# Altium footprint library Connectors.PcbLib: 79 footprints (part 1 of 5)
Each footprint in its own frame and in the unit in brackets; x right, y up, seen from the top. Pads: shape width x height; smd on the part's side, far side on the other; paste and mask are expansions set on the pad; w line width, h text height; cw(c..) or ccw(c..) is an arc to the next point about the centre after c.
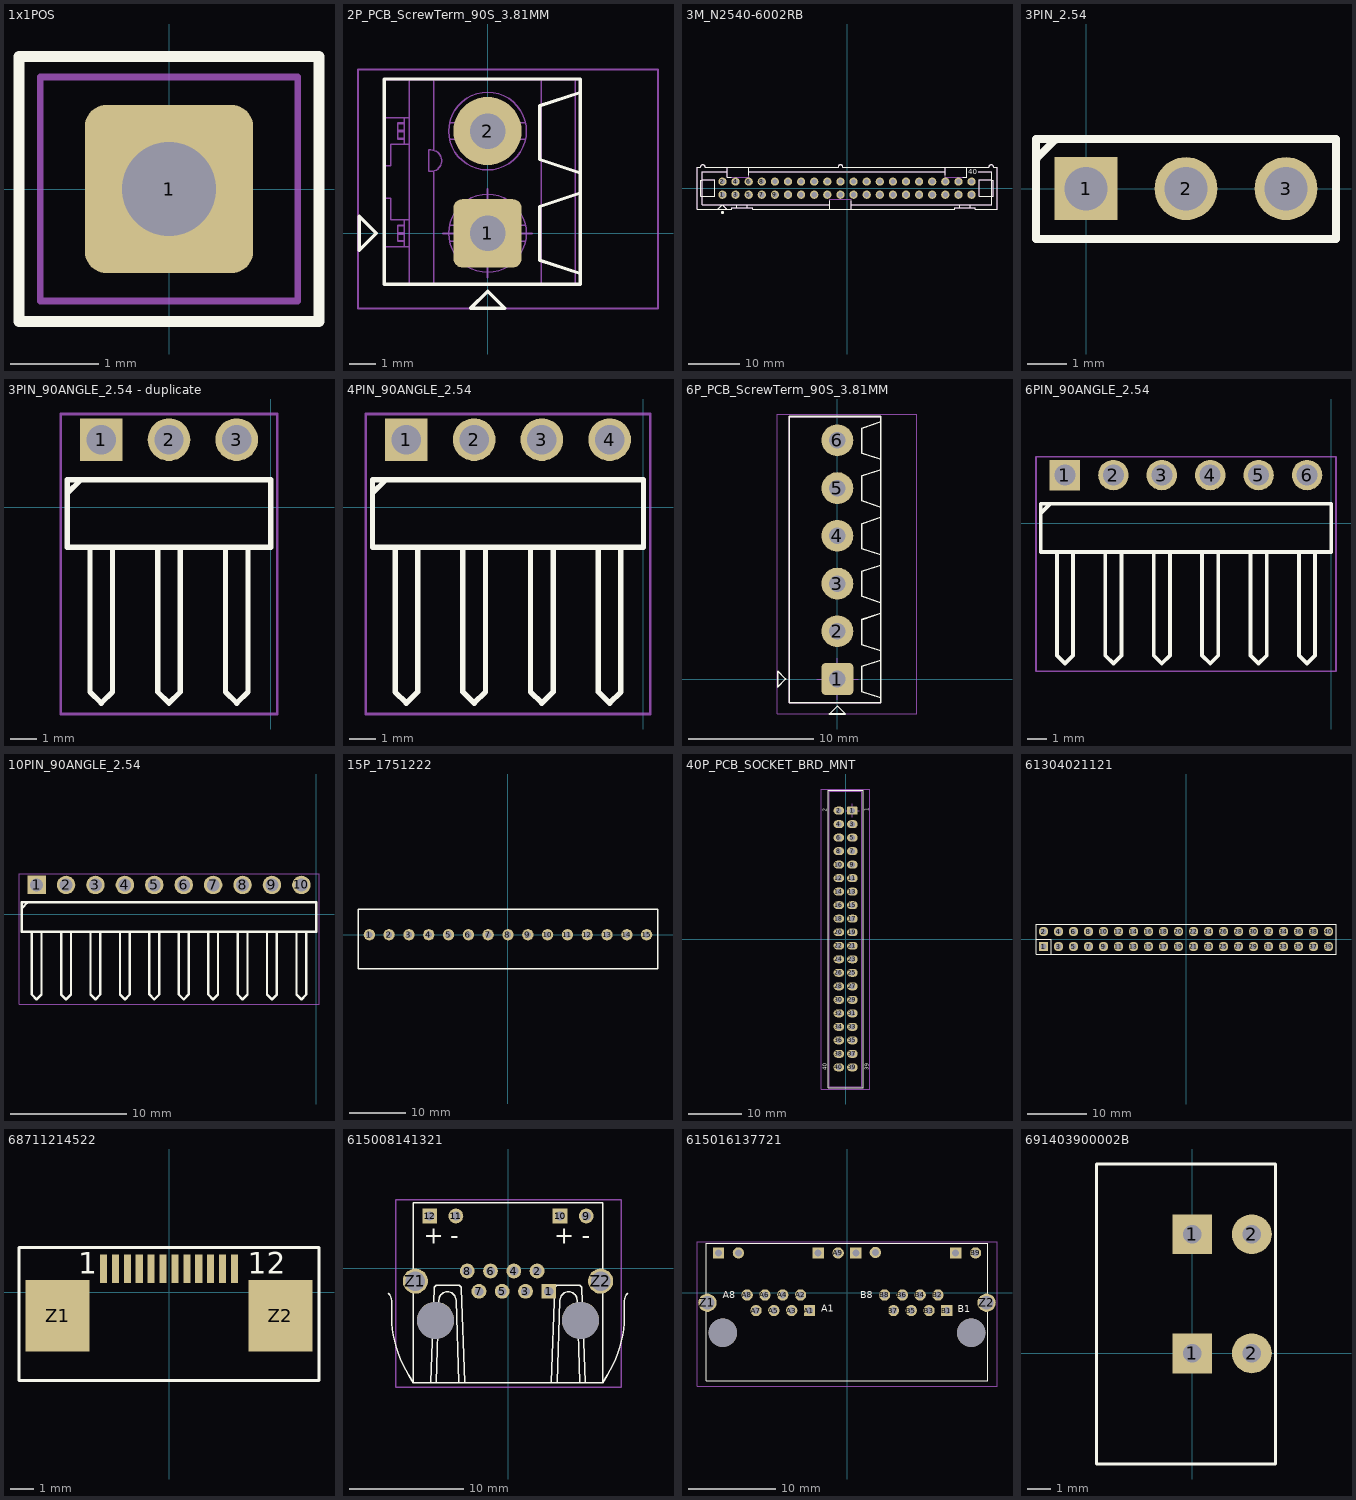
[diagram p0: the footprints below, top view; thin cyan lines are the x and y axes]

## 1x1POS [mil] "Connector Header, Single-row 1-position, 0.100\" pitch"
height 267
pads (1):
  rrect25% 75x75 hole 42: 1(0,0)
Top Overlay:
  lines w5: -66.93,-59.06 66.93,-59.06 66.93,59.06 -66.93,59.06 -66.93,-59.06
Mechanical 13:
  lines w3: -57.47,-50 57.49,-50 57.49,50 -57.47,50 -57.47,-50
3D body "PinHeaderMating 1P.stp": height 267, standoff -118, extent -57.47,-50 57.49,50

## 2P_PCB_ScrewTerm_90S_3.81MM [mil] "TERM BLOCK 2POS SIDE ENT STACKABLE 3.81MM"
height 334.65
pads (2):
  rrect25% 100x100 hole 52: 1(0,0)
  round 100 hole 52: 2(0,150)
Top Overlay:
  lines w5: 135.83,-59.06 76.78,-39.37 76.78,39.37 135.83,59.06 ; 135.83,88.58 76.78,108.27 76.78,187.01 135.83,206.69 ; -188,-25 -188,25 -163,0 -188,-25 ; -151.57,-75 135.83,-75 135.83,226.38 -151.57,226.38 -151.57,-75 ; -25,-110 0,-85 25,-110 -25,-110
Mechanical 13:
  circle w1.97: c0,150 r57.09
  circle w1.97: c0,0 r57.09
  lines w1.97: -151.57,-19.69 -114.76,-19.69 -114.76,19.68 -141.73,19.68 -141.73,51.18 -151.57,51.18 ; -151.57,98.82 -141.73,98.82 -141.73,130.31 -114.76,130.31 -114.76,169.69 -151.57,169.69 ; -131.89,-10.91 -122.05,-10.91 ; -131.89,-1.06 -122.05,-1.06 ; -131.89,1.06 -122.05,1.06 ; -131.89,10.91 -122.05,10.91 ; -131.89,139.09 -122.05,139.09 ; -131.89,148.94 -122.05,148.94 ; -131.89,151.06 -122.05,151.06 ; -131.89,160.91 -122.05,160.91 ; -122.05,-19.69 -122.05,19.68 ; -122.05,-11.81 -131.89,-11.81 -131.89,11.81 -122.05,11.81 ; -122.05,130.31 -122.05,169.69 ; -122.05,138.19 -131.89,138.19 -131.89,161.81 -122.05,161.81 ; -114.56,-75 -114.56,225 ; -78.74,-75 -78.74,91.34 ; -78.74,121.65 -78.74,225 ; -55.85,-11.81 55.85,-11.81 ; -55.85,11.81 55.85,11.81 ; -55.85,138.19 55.85,138.19 ; -55.85,161.81 55.85,161.81 ; 78.74,-75 78.74,225 ; 128.89,-75 128.89,225 ; -151.57,-75 135.83,-75 135.83,225 -151.57,225 -151.57,-75 ; -85.91,90.75 -85.91,122.24 -83.03,122.24 cw(c-83.03,106.5) -83.03,90.75 -85.91,90.75
Mechanical 15:
  lines w3: -65,0 65,0 ; 0,-65 0,65 ; -190,-110 250,-110 250,240 -190,240 -190,-110
3D body "c-1776113-2-o-3d.stp": height 334.65, standoff -137.8, extent -151.57,-75.19 135.83,224.81

## 3M_N2540-6002RB [mm] "40 Contacts - Straight .100\" x .100\" Low Profile Four-Wall Header"
height 10.03
pads (40):
  round 1.6 hole 1: 1(-24.13,-1.27) 2(-24.13,1.27) 3(-21.59,-1.27) 4(-21.59,1.27) 5(-19.05,-1.27) 6(-19.05,1.27) 7(-16.51,-1.27) 8(-16.51,1.27) 9(-13.97,-1.27) 10(-13.97,1.27) 11(-11.43,-1.27) 12(-11.43,1.27) 13(-8.89,-1.27) 14(-8.89,1.27) 15(-6.35,-1.27) 16(-6.35,1.27) 17(-3.81,-1.27) 18(-3.81,1.27) 19(-1.27,-1.27) 20(-1.27,1.27) 21(1.27,-1.27) 22(1.27,1.27) 23(3.81,-1.27) 24(3.81,1.27) 25(6.35,-1.27) 26(6.35,1.27) 27(8.89,-1.27) 28(8.89,1.27) 29(11.43,-1.27) 30(11.43,1.27) 31(13.97,-1.27) 32(13.97,1.27) 33(16.51,-1.27) 34(16.51,1.27) 35(19.05,-1.27) 36(19.05,1.27) 37(21.59,-1.27) 38(21.59,1.27) 39(24.13,-1.27) 40(24.13,1.27)
Top Overlay:
  circle w0.3: c-24.13,-4.699 r0.15
  lines w0.2: -28.042,-1.603 -25.629,-1.603 -25.629,1.603 -28.042,1.603 ; -28.042,-1.524 -28.346,-1.524 -28.346,1.524 -28.042,1.524 ; -24.994,-4.064 -24.13,-3.2 -23.266,-4.064 ; -23.178,3.15 -28.042,3.15 -28.042,-3.2 -3.366,-3.2 ; -23.178,4.064 -23.178,2.159 -22.469,2.159 ; -21.361,-3.835 -21.361,-3.2 ; -19.279,-3.835 -19.279,-3.2 ; -18.987,2.518 -18.987,4.064 ; -18.987,3.15 18.987,3.15 ; -3.366,-4.064 -3.366,-2.438 ; 0.826,-4.064 0.826,-2.438 ; 0.826,-3.2 28.042,-3.2 28.042,3.15 25.4,3.15 ; 18.987,2.518 18.987,4.064 ; 21.819,-3.835 21.819,-3.2 ; 22.469,2.159 23.178,2.159 23.178,4.064 ; 23.901,-3.835 23.901,-3.2 ; 28.042,-1.603 25.629,-1.603 25.629,1.603 28.042,1.603 ; 28.042,-1.524 28.346,-1.524 28.346,1.524 28.042,1.524 ; -29.058,-4.064 -29.058,4.064 -28.397,4.064 cw(c-27.94,4.064) -27.483,4.064 -1.727,4.064 cw(c-1.27,4.064) -0.813,4.064 27.483,4.064 cw(c27.94,4.064) 28.397,4.064 29.058,4.064 29.058,-4.064 24.892,-4.064 24.892,-3.835 20.828,-3.835 20.828,-4.064 -18.288,-4.064 -18.288,-3.835 -22.352,-3.835 -22.352,-4.064 -29.058,-4.064
  text "40" at 23.495,2.667 h1.02
Mechanical 14:
  lines w0.1: -28.042,-1.603 -25.629,-1.603 -25.629,1.603 -28.042,1.603 ; -28.042,-1.524 -28.346,-1.524 -28.346,1.524 -28.042,1.524 ; -24.994,-4.064 -24.13,-3.2 -23.266,-4.064 ; -23.178,3.15 -28.042,3.15 -28.042,-3.2 -3.366,-3.2 ; -23.178,4.064 -23.178,2.159 -18.987,2.159 -18.987,4.064 ; -21.361,-3.835 -21.361,-3.2 ; -19.279,-3.835 -19.279,-3.2 ; -18.987,3.15 18.987,3.15 ; -3.366,-4.064 -3.366,-2.159 0.826,-2.159 0.826,-4.064 ; 0.826,-3.2 28.042,-3.2 28.042,3.15 25.4,3.15 ; 18.987,4.064 18.987,2.159 23.178,2.159 23.178,4.064 ; 21.819,-3.835 21.819,-3.2 ; 23.901,-3.835 23.901,-3.2 ; 28.042,-1.603 25.629,-1.603 25.629,1.603 28.042,1.603 ; 28.042,-1.524 28.346,-1.524 28.346,1.524 28.042,1.524 ; -29.058,-4.064 -29.058,4.064 -28.397,4.064 cw(c-27.94,4.064) -27.483,4.064 -1.727,4.064 cw(c-1.27,4.064) -0.813,4.064 27.483,4.064 cw(c27.94,4.064) 28.397,4.064 29.058,4.064 29.058,-4.064 24.892,-4.064 24.892,-3.835 20.828,-3.835 20.828,-4.064 -18.288,-4.064 -18.288,-3.835 -22.352,-3.835 -22.352,-4.064 -29.058,-4.064
  text "40" at 23.495,2.667 h1.02
3D body "3M_N2540-6002RB.stp": height 9.65, standoff -2.59, extent -29.058,-4.064 29.058,4.572

## 3PIN_2.54 [mm] "3 pins, 1 row"
height 2.54
pads (3):
  rect 1.6x1.6 hole 1.1: 1(0,0)
  round 1.6 hole 1.1: 2(2.54,0) 3(5.08,0)
Top Overlay:
  lines w0.2: -1.228,0.794 -0.804,1.218 ; -1.27,-1.28 -1.27,1.26 6.35,1.26 6.35,-1.28 -1.27,-1.28
3D body "User Library-jumper 2_54mm.step": height 8.3, standoff 2.3, extent 1.3,-1.2 6.3,1.2
3D body "User Library-Header_Male_3Pin.STEP": height 8.54, standoff -3, extent -1.27,-1.245 6.35,1.245

## 3PIN_90ANGLE_2.54 - duplicate [mm] "3 pins, 1 row, right angled, gold plating"
height 2.54
pads (3):
  rect 1.6x1.6 hole 1.1: 1(-6.35,2.54)
  round 1.6 hole 1.1: 2(-3.81,2.54) 3(-1.27,2.54)
Top Overlay:
  lines w0.2: -7.578,0.574 -7.154,0.998 ; -6.773,-1.525 -6.773,-6.919 -6.35,-7.342 -5.927,-6.919 -5.927,-1.5 ; -4.233,-1.525 -4.233,-6.919 -3.81,-7.342 -3.387,-6.919 -3.387,-1.525 ; -1.693,-1.525 -1.693,-6.919 -1.27,-7.342 -0.847,-6.919 -0.847,-1.5 ; -7.62,-1.5 -7.62,1.04 0,1.04 0,-1.5 -7.62,-1.5
Mechanical 15:
  lines w0.1: -7.87,-7.75 0.25,-7.75 0.25,3.5 -7.87,3.5 -7.87,-7.75
3D body "61300311021.stp": height 2.55, standoff -2.99, extent -7.62,-7.524 0,2.836

## 4PIN_90ANGLE_2.54 [mm] "4 pins, 1 row, right angled, gold plating"
height 2.54
pads (4):
  rect 1.6x1.6 hole 1.1: 1(-8.89,2.54)
  round 1.6 hole 1.1: 2(-6.35,2.54) 3(-3.81,2.54) 4(-1.27,2.54)
Top Overlay:
  lines w0.2: -10.118,0.574 -9.694,0.998 ; -9.313,-1.525 -9.313,-6.919 -8.89,-7.342 -8.467,-6.919 -8.467,-1.5 ; -6.773,-1.525 -6.773,-6.919 -6.35,-7.342 -5.927,-6.919 -5.927,-1.525 ; -4.233,-1.525 -4.233,-6.919 -3.81,-7.342 -3.387,-6.919 -3.387,-1.5 ; -1.693,-1.525 -1.693,-6.919 -1.27,-7.342 -0.847,-6.919 -0.847,-1.525 ; -10.16,-1.5 0,-1.5 0,1.04 -10.16,1.04 -10.16,-1.5
Mechanical 15:
  lines w0.1: -10.41,-7.75 -10.41,3.5 0.25,3.5 0.25,-7.75 -10.41,-7.75
3D body "61300411021.stp": height 2.54, standoff -3, extent -10.16,-7.566 0,2.794

## 6P_PCB_ScrewTerm_90S_3.81MM [mil] "TERM BLOCK 6POS SIDE ENT STACKABLE 3.81MM"
height 334.65
pads (6):
  rrect25% 100x100 hole 52: 1(0,0)
  round 100 hole 52: 2(0,150) 3(0,300) 4(0,450) 5(0,600) 6(0,750)
Top Overlay:
  lines w5: 135.83,-59.06 76.78,-39.37 76.78,39.37 135.83,59.06 ; 135.83,88.58 76.78,108.27 76.78,187.01 135.83,206.69 ; 135.83,240 76.78,259.69 76.78,338.43 135.83,358.11 ; 135.83,390 76.78,409.69 76.78,488.43 135.83,508.11 ; 135.83,540 76.78,559.68 76.78,638.43 135.83,658.11 ; 135.83,690 76.78,709.68 76.78,788.43 135.83,808.11 ; -188,-25 -188,25 -163,0 -188,-25 ; -151.57,-75 135.83,-75 135.83,825 -151.57,825 -151.57,-75 ; -25,-110 0,-85 25,-110 -25,-110
Mechanical 13:
  lines w3: -151.57,-75 -151.57,825 135.83,825 135.83,-75 -151.57,-75
Mechanical 15:
  lines w3: -65,0 65,0 ; 0,-65 0,65 ; -190,-110 250,-110 250,832.88 -190,832.88 -190,-110
3D body "c-1776113-6-o-3d.stp": height 335.25, standoff -137.2, extent -151.57,-75 135.83,825

## 6PIN_90ANGLE_2.54 [mm] "6 pins, 1 row, right angled, gold plating"
height 2.54
pads (6):
  rect 1.6x1.6 hole 1.1: 1(-13.97,2.54)
  round 1.6 hole 1.1: 2(-11.43,2.54) 3(-8.89,2.54) 4(-6.35,2.54) 5(-3.81,2.54) 6(-1.27,2.54)
Top Overlay:
  lines w0.2: -15.198,0.574 -14.774,0.998 ; -14.393,-1.525 -14.393,-6.919 -13.97,-7.342 -13.547,-6.919 -13.547,-1.5 ; -11.853,-1.525 -11.853,-6.919 -11.43,-7.342 -11.007,-6.919 -11.007,-1.525 ; -9.313,-1.525 -9.313,-6.919 -8.89,-7.342 -8.467,-6.919 -8.467,-1.5 ; -6.773,-1.525 -6.773,-6.919 -6.35,-7.342 -5.927,-6.919 -5.927,-1.525 ; -4.233,-1.525 -4.233,-6.919 -3.81,-7.342 -3.387,-6.919 -3.387,-1.5 ; -1.693,-1.525 -1.693,-6.919 -1.27,-7.342 -0.847,-6.919 -0.847,-1.525 ; -15.24,-1.5 -15.24,1.04 0,1.04 0,-1.5 -15.24,-1.5
Mechanical 15:
  lines w0.1: -15.49,-7.75 0.25,-7.75 0.25,3.5 -15.49,3.5 -15.49,-7.75
3D body "61300611021.stp": height 2.54, standoff -3, extent -15.24,-7.524 0,2.836

## 10PIN_90ANGLE_2.54 [mm] "10 pins, 1 row, right angled, gold plating"
height 2.54
pads (10):
  rect 1.6x1.6 hole 1.1: 1(-24.13,2.54)
  round 1.6 hole 1.1: 2(-21.59,2.54) 3(-19.05,2.54) 4(-16.51,2.54) 5(-13.97,2.54) 6(-11.43,2.54) 7(-8.89,2.54) 8(-6.35,2.54) 9(-3.81,2.54) 10(-1.27,2.54)
Top Overlay:
  lines w0.2: -25.358,0.574 -24.934,0.998 ; -24.553,-1.525 -24.553,-6.919 -24.13,-7.342 -23.707,-6.919 -23.707,-1.5 ; -22.013,-1.525 -22.013,-6.919 -21.59,-7.342 -21.167,-6.919 -21.167,-1.525 ; -19.473,-1.525 -19.473,-6.919 -19.05,-7.342 -18.627,-6.919 -18.627,-1.5 ; -16.933,-1.525 -16.933,-6.919 -16.51,-7.342 -16.087,-6.919 -16.087,-1.525 ; -14.393,-1.525 -14.393,-6.919 -13.97,-7.342 -13.547,-6.919 -13.547,-1.5 ; -11.853,-1.525 -11.853,-6.919 -11.43,-7.342 -11.007,-6.919 -11.007,-1.525 ; -9.313,-1.525 -9.313,-6.919 -8.89,-7.342 -8.467,-6.919 -8.467,-1.5 ; -6.773,-1.525 -6.773,-6.919 -6.35,-7.342 -5.927,-6.919 -5.927,-1.525 ; -4.233,-1.525 -4.233,-6.919 -3.81,-7.342 -3.387,-6.919 -3.387,-1.5 ; -1.693,-1.525 -1.693,-6.919 -1.27,-7.342 -0.847,-6.919 -0.847,-1.525 ; -25.4,-1.5 0,-1.5 0,1.04 -25.4,1.04 -25.4,-1.5
Mechanical 15:
  lines w0.1: -25.65,-7.75 0.25,-7.75 0.25,3.5 -25.65,3.5 -25.65,-7.75
3D body "61301011021.stp": height 2.55, standoff -2.99, extent -25.4,-7.524 0,2.836

## 15P_1751222 [mm] "Phoenix Contact 3.5mm pitch"
pads (15):
  round 2 hole 1.1: 1(-24.5,0) 2(-21,0) 3(-17.5,0) 4(-14,0) 5(-10.5,0) 6(-7,0) 7(-3.5,0) 8(0,0) 9(3.5,0) 10(7,0) 11(10.5,0) 12(14,0) 13(17.5,0) 14(21,0) 15(24.5,0)
Top Overlay:
  lines w0.254: -26.5,-6 -26.5,4.5 26.5,4.5 26.5,-6 -26.5,-6
3D body "63093.stp": height 9.5, standoff -3.5, extent -26.5,-5.7 26.5,4.3

## 40P_PCB_SOCKET_BRD_MNT [mm] "SOCKET BRD MNT 40POS 2.54MM"
height 10.8
pads (40):
  rrect25% 2x1.5 hole 1.067: 1(1.27,24.13)
  oval 2x1.5 hole 1.067: 2(-1.27,24.13) 3(1.27,21.59) 4(-1.27,21.59) 5(1.27,19.05) 6(-1.27,19.05) 7(1.27,16.51) 8(-1.27,16.51) 9(1.27,13.97) 10(-1.27,13.97) 11(1.27,11.43) 12(-1.27,11.43) 13(1.27,8.89) 14(-1.27,8.89) 15(1.27,6.35) 16(-1.27,6.35) 17(1.27,3.81) 18(-1.27,3.81) 19(1.27,1.27) 20(-1.27,1.27) 21(1.27,-1.27) 22(-1.27,-1.27) 23(1.27,-3.81) 24(-1.27,-3.81) 25(1.27,-6.35) 26(-1.27,-6.35) 27(1.27,-8.89) 28(-1.27,-8.89) 29(1.27,-11.43) 30(-1.27,-11.43) 31(1.27,-13.97) 32(-1.27,-13.97) 33(1.27,-16.51) 34(-1.27,-16.51) 35(1.27,-19.05) 36(-1.27,-19.05) 37(1.27,-21.59) 38(-1.27,-21.59) 39(1.27,-24.13) 40(-1.27,-24.13)
Top Overlay:
  lines w0.127: -3.302,-27.94 3.302,-27.94 3.302,27.94 -3.302,27.94 -3.302,-27.94
  text "1" at 4.318,24.003 h0.76
  text "2" at -3.556,23.876 h0.76
  text "39" at 4.318,-24.714 h0.76
  text "40" at -3.556,-24.714 h0.76
Mechanical 13:
  lines w0.076: -3.05,-27.73 -3.05,27.73 3.05,27.73 3.05,-27.73 -3.05,-27.73
Mechanical 15:
  lines w0.076: 0,24.13 2.54,24.13 ; 1.27,22.86 1.27,25.4 ; -4.572,-28.194 4.572,-28.194 4.572,28.194 -4.572,28.194 -4.572,-28.194
3D body "40P BoxHeader.STEP": height 10.8, standoff -2.54, extent -3.05,-27.73 4.05,27.73

## 61304021121 [mm] "40 pins, dual pin, straight, gold plating"
height 8.54
pads (40):
  rect 1.6x1.6 hole 1.1: 1(-24.13,-1.27)
  round 1.6 hole 1.1: 2(-24.13,1.27) 3(-21.59,-1.27) 4(-21.59,1.27) 5(-19.05,-1.27) 6(-19.05,1.27) 7(-16.51,-1.27) 8(-16.51,1.27) 9(-13.97,-1.27) 10(-13.97,1.27) 11(-11.43,-1.27) 12(-11.43,1.27) 13(-8.89,-1.27) 14(-8.89,1.27) 15(-6.35,-1.27) 16(-6.35,1.27) 17(-3.81,-1.27) 18(-3.81,1.27) 19(-1.27,-1.27) 20(-1.27,1.27) 21(1.27,-1.27) 22(1.27,1.27) 23(3.81,-1.27) 24(3.81,1.27) 25(6.35,-1.27) 26(6.35,1.27) 27(8.89,-1.27) 28(8.89,1.27) 29(11.43,-1.27) 30(11.43,1.27) 31(13.97,-1.27) 32(13.97,1.27) 33(16.51,-1.27) 34(16.51,1.27) 35(19.05,-1.27) 36(19.05,1.27) 37(21.59,-1.27) 38(21.59,1.27) 39(24.13,-1.27) 40(24.13,1.27)
Top Overlay:
  lines w0.2: -25.4,0 -22.86,0 -22.86,-2.54 ; -25.4,-2.54 25.4,-2.54 25.4,2.54 -25.4,2.54 -25.4,-2.54
3D body "61304021121.stp": height 8.55, standoff -2.99, extent -25.4,-2.54 25.4,2.54

## 68711214522 [mm] "12 pins"
height 2.1
pads (14):
  rect 0.3x1.2 smd: 1(-2.75,0.99) 2(-2.25,0.99) 3(-1.75,0.99) 4(-1.25,0.99) 5(-0.75,0.99) 6(-0.25,0.99) 7(0.25,0.99) 8(0.75,0.99) 9(1.25,0.99) 10(1.75,0.99) 11(2.25,0.99) 12(2.75,0.99)
  rect 2.7x3 smd: Z1(-4.68,-0.99) Z2(4.68,-0.99)
Top Overlay:
  lines w0.127: -6.3,-3.71 -6.3,1.89 6.3,1.89 6.3,-3.71 -6.3,-3.71
  text "1" at -3.81,0.771 h0.9
  text "12" at 3.302,0.771 h0.9
3D body "68711214522.stp": height 2.06, standoff -0.04, extent -6.2,-3.71 6.2,1.39

## 615008141321 [mm] "Horizontal Shielded 1x1 TH LED 2x Bipolar Green/Yellow Green=Fw EMI  fingers  8P8C Tab Up"
height 13.25
pads (16):
  rect 1.3x1.3 hole 0.8: 1(3.57,-2.03) 10(4.57,4.57) 12(-6.86,4.57)
  round 1.3 hole 0.8: 2(2.55,-0.25) 3(1.53,-2.03) 4(0.51,-0.25) 5(-0.51,-2.03) 6(-1.53,-0.25) 7(-2.55,-2.03) 8(-3.57,-0.25) 9(6.86,4.57) 11(-4.57,4.57)
  round 2.2 hole 1.7: Z1(-8.125,-1.14) Z2(8.125,-1.14)
  round 3.25 hole 3.25 unplated: ""(-6.35,-4.57) ""(6.35,-4.57)
Top Overlay:
  lines w0.127: -10.489,-2.184 cw(c-11.66,-3.106) -10.174,-3.232 ccw(c-0.302,-4.113) -8.707,-9.366 -8.288,-10.03 ; -6.795,-9.983 -6.48,-1.777 cw(c-6.189,-1.788) -6.2,-1.497 -4.38,-1.497 cw(c-4.392,-1.788) -4.101,-1.777 -3.786,-9.983 ; -6.27,-9.983 -6.06,-2.791 cw(c-5.308,-2.814) -4.556,-2.791 -4.311,-10.019 ; 3.786,-9.983 4.101,-1.777 cw(c4.392,-1.788) 4.381,-1.497 6.2,-1.497 cw(c6.189,-1.788) 6.48,-1.777 6.795,-9.983 ; 4.311,-10.019 4.555,-2.791 cw(c5.308,-2.814) 6.06,-2.791 6.27,-9.983 ; 8.682,-9.405 8.288,-10.03 ; 8.707,-9.366 ccw(c0.302,-4.113) 10.174,-3.232 cw(c11.66,-3.106) 10.489,-2.184 ; -8.288,-10.03 8.288,-10.03 ; -8.288,-10.03 -8.288,5.72 8.288,5.72 8.288,-10.03 ; -8.288,-10.03 8.288,-10.03
  text "-" at 6.477,2.162 h1.52
  text "-" at -5.08,2.162 h1.52
  text "+" at 4.064,2.162 h1.52
  text "+" at -7.366,2.162 h1.52
Mechanical 15:
  lines w0.127: -9.835,-10.45 -9.835,5.99 9.915,5.99 9.915,-10.45 -9.835,-10.45
3D body "615008141321.stp": height 15, standoff -3.44, extent -9.835,-10.45 9.915,6

## 615016137721 [mm] "RJ45 Horizontal Dual port Shielded  With LED With EMI panel ground Tab up - left yellow - right green"
height 13.2
pads (28):
  rect 1.3x1.3 hole 0.8: A1(-4.305,-2.056) A10(-3.305,4.544) A12(-14.735,4.544) B1(11.445,-2.056) B10(12.445,4.544) B12(1.015,4.544)
  round 1.3 hole 0.8: A2(-5.325,-0.276) A3(-6.345,-2.056) A4(-7.365,-0.276) A5(-8.385,-2.056) A6(-9.405,-0.276) A7(-10.425,-2.056) A8(-11.445,-0.276) A9(-1.015,4.544) A11(-12.445,4.544) B2(10.425,-0.276) B3(9.405,-2.056) B4(8.385,-0.276) B5(7.365,-2.056) B6(6.345,-0.276) B7(5.325,-2.056) B8(4.305,-0.276) B9(14.735,4.544) B11(3.251,4.596)
  round 2.1 hole 1.6: Z1(-16,-1.166) Z2(16,-1.166)
  round 3.25 hole 3.25 unplated: ""(-14.225,-4.596) ""(14.225,-4.596)
Top Overlay:
  lines w0.127: -16.125,-10.096 16.125,-10.096 16.125,5.654 -16.125,5.654 -16.125,-10.096
  text "A1" at -2.925,-2.2 h0.8
  text "A8" at -14.225,-0.675 h0.8
  text "B1" at 12.675,-2.275 h0.8
  text "B8" at 1.525,-0.675 h0.8
Mechanical 15:
  lines w0.127: -17.192,-10.75 17.192,-10.75 17.192,5.84 -17.192,5.84 -17.192,-10.75
3D body "615016137721.stp": height 14.52, standoff -3.5, extent -17.187,-10.71 17.187,5.84

## 691403900002B [mm] "2,54mm - Spring clamp/Screwless - Vertical wire entry - 02p"
height 13.6
pads (4):
  rect 1.7x1.7 hole 0.8: 1(0,0) 1(0,5.08)
  round 1.7 hole 0.8: 2(2.54,0) 2(2.54,5.08)
Top Overlay:
  lines w0.127: -4.08,-4.72 3.54,-4.72 3.54,8.08 -4.08,8.08 -4.08,-4.72
3D body "691403900002B.stp": height 13.61, standoff -3.49, extent -4.08,-4.72 3.54,8.08